# Altium footprint library Main_MCU_2020-08-18_21-02-23.PcbLib: 24 footprints (part 1 of 2)
Each footprint in its own frame and in the unit in brackets; x right, y up, seen from the top. Pads: shape width x height; smd on the part's side, far side on the other; paste and mask are expansions set on the pad; w line width, h text height; cw(c..) or ccw(c..) is an arc to the next point about the centre after c.
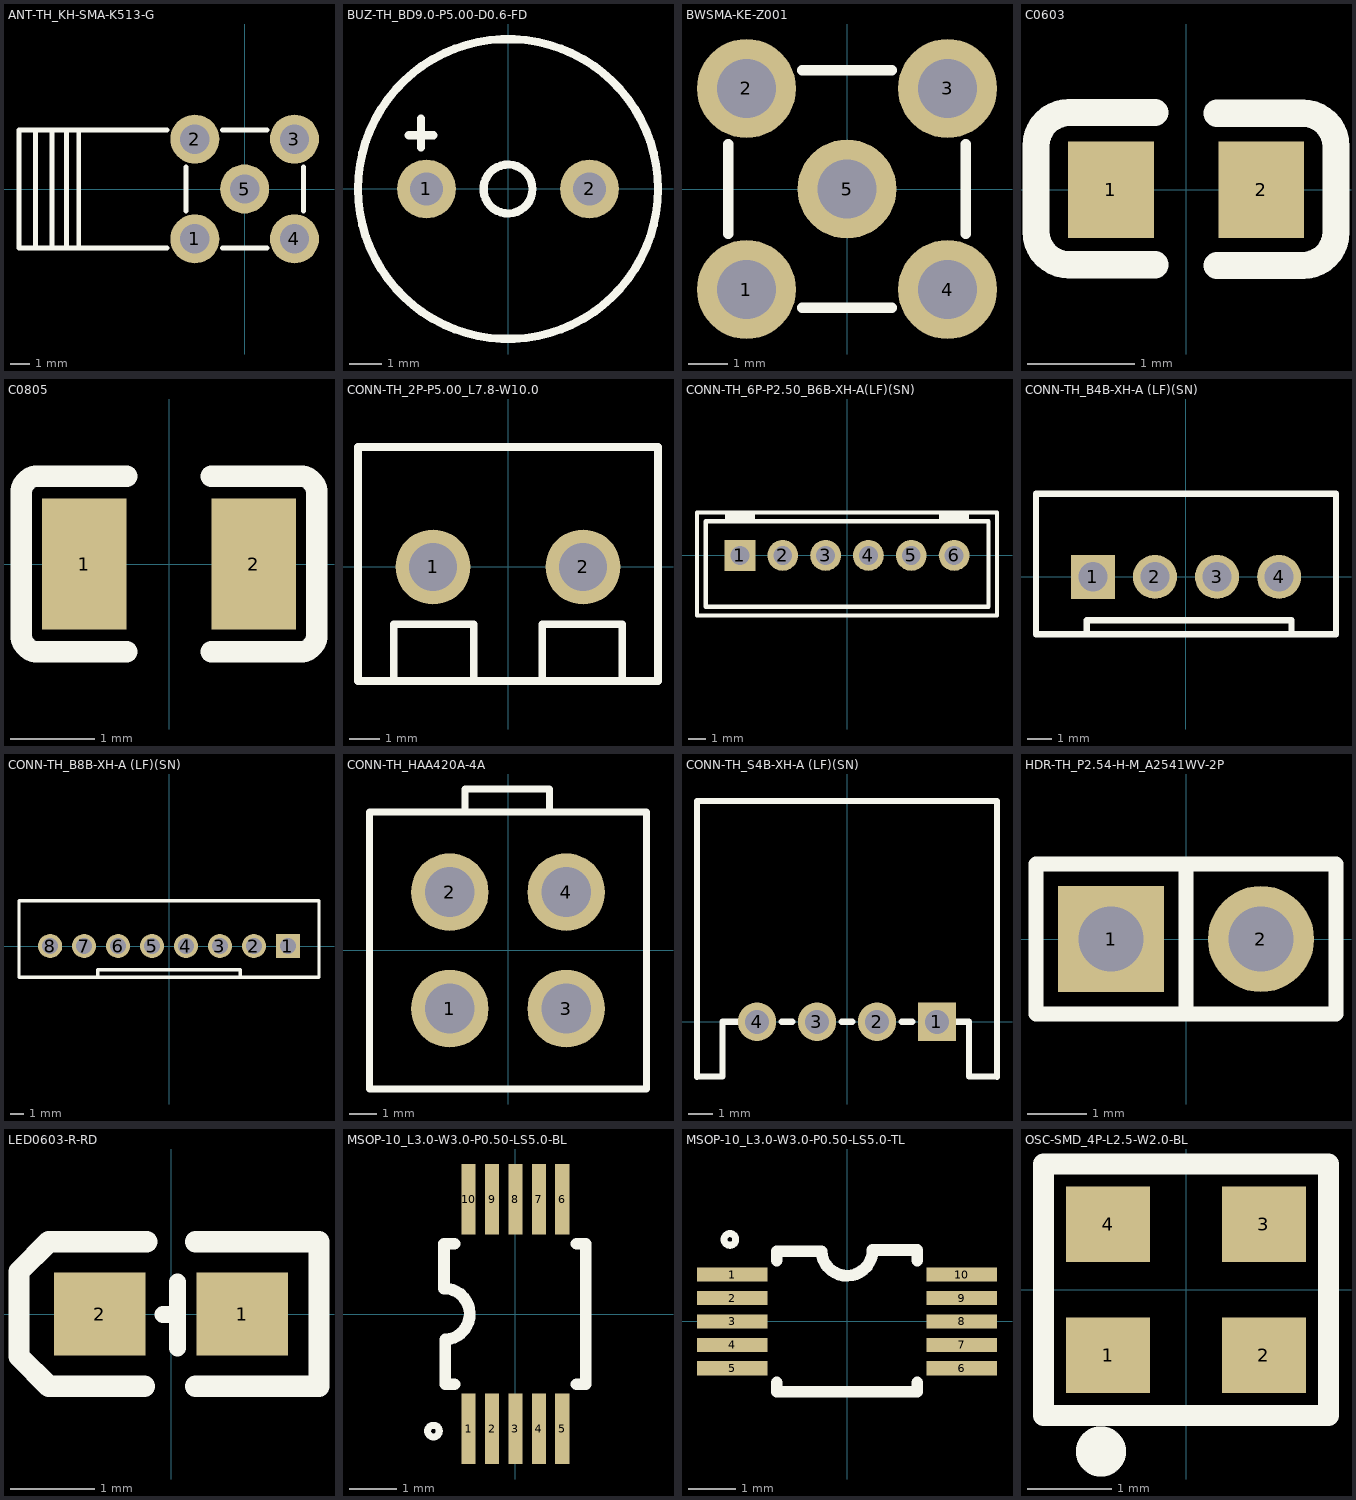
[diagram p0: the footprints below, top view; thin cyan lines are the x and y axes]

## ANT-TH_KH-SMA-K513-G [mm]
pads (5):
  round 2.5 hole 1.5: 1(-2.54,-2.54) 2(-2.54,2.54) 3(2.54,2.54) 4(2.54,-2.54) 5(0,0)
Top Overlay:
  lines w0.254: -10.668,-3 -10.668,3 ; -9.966,3 -9.573,3 ; -9.827,-3 -9.827,3 ; -9.09,-3 -9.09,3 ; -8.595,3 -8.176,3 ; -8.455,-3 -8.455,3 ; -3.948,-3 -11.5,-3 -11.5,3 -3.948,3 ; -3,-1.132 -3,1.132 ; -1.132,-3 1.132,-3 ; -1.132,3 1.132,3 ; 3,-1.132 3,1.132
3D body "SMA-J-P-H-RA-TH1--3DModel-STEP-56544.STEP": height 9.86, standoff -3.94, extent -11.6,-3.5 3.5,3.5

## BUZ-TH_BD9.0-P5.00-D0.6-FD [mm]
pads (2):
  round 1.8 hole 1: 1(-2.5,0) 2(2.5,0)
Top Overlay:
  circle w0.254: c0,0 r4.6
  circle w0.254: c0,0 r0.75
  lines w0.254: -3.048,1.651 -2.286,1.651 ; -2.667,1.27 -2.667,2.159
3D body "CUI_DEVICES_CPE-171.step": height 8, standoff -4, extent -4.483,-4.5 4.517,4.5

## BWSMA-KE-Z001 [mm] "SMA 50Ohm Coaxial Connectors"
pads (5):
  round 2.5 hole 1.5: 1(-2.54,-2.54) 2(-2.54,2.54) 3(2.54,2.54) 4(2.54,-2.54) 5(0,0)
Top Overlay:
  lines w0.254: -3,-1.132 -3,1.132 ; -1.132,-3 1.132,-3 ; -1.132,3 1.132,3 ; 3,-1.132 3,1.132
3D body "733910060.stp": height 9.55, standoff -3.95, extent -3.129,-3.128 3.129,3.128

## C0603 [mm]
pads (2):
  rect 0.8x0.9 smd: 1(-0.7,0) 2(0.7,0)
Top Overlay:
  lines w0.254: -0.289,-0.698 -1.089,-0.698 cw(c-1.089,-0.388) -1.399,-0.388 -1.398,0.412 cw(c-1.089,0.412) -1.089,0.722 -0.289,0.722 ; 0.287,-0.704 1.087,-0.704 ccw(c1.087,-0.394) 1.397,-0.394 1.397,0.406 ccw(c1.087,0.406) 1.087,0.716 0.287,0.716
3D body "C_0603_1608Metric.step": height 0.8, standoff 0, extent -0.8,-0.4 0.8,0.4

## C0805 [mm]
pads (2):
  rect 1x1.55 smd: 1(-1,0) 2(1,0)
Top Overlay:
  lines w0.254: -1.75,0.82 -1.75,0.8 ; -0.5,-1.04 -1.55,-1.04 cw(c-1.55,-0.84) -1.75,-0.84 -1.75,-0.8 -1.75,0.8 ; -0.5,1.04 -1.55,1.04 ccw(c-1.55,0.84) -1.75,0.84 -1.75,0.8 ; 0.5,-1.04 1.55,-1.04 ccw(c1.55,-0.84) 1.75,-0.84 1.75,-0.8 1.75,0.8 1.75,0.84 ccw(c1.55,0.84) 1.55,1.04 0.5,1.04
3D body "C_0805_2012Metric.step": height 1.25, standoff 0, extent -1,-0.615 1,0.635

## CONN-TH_2P-P5.00_L7.8-W10.0 [mm]
pads (2):
  round 2.5 hole 1.6: 1(-2.5,0) 2(2.5,0)
Top Overlay:
  lines w0.254: -3.81,-3.683 -3.81,-1.905 -1.143,-1.905 -1.143,-3.683 ; 1.143,-3.683 1.143,-1.905 3.81,-1.905 3.81,-3.683 ; -5,-3.8 -5,4 5,4 5,-3.8 -5,-3.8
3D body "1729018.stp": height 3.5, standoff -10, extent -4.904,-3.705 5.666,4.445

## CONN-TH_6P-P2.50_B6B-XH-A(LF)(SN) [mm]
pads (6):
  rect 1.8x1.8 hole 1.1: 1(-6.251,0.001)
  round 1.8 hole 1.1: 2(-3.749,-0.001) 3(-1.249,-0.001) 4(1.251,-0.001) 5(3.751,-0.001) 6(6.251,-0.001)
Top Overlay:
  lines w0.254: -7,2 -7,2.5 ; -7,2.25 -5.5,2.25 ; -5.5,2 -5.5,2.5 ; 5.501,2 5.501,2.5 ; 5.501,2.25 7.001,2.25 ; 7.001,2 7.001,2.5 ; -8.75,-3.5 -8.75,2.5 8.75,2.5 8.75,-3.5 -8.75,-3.5 ; -8.25,-3 -8.25,2 8.251,2 8.251,-3 -8.25,-3
3D body "JST_XH_B6B-XH-A_1x06_P2.50mm_Vertical.step": height 7, standoff -3.4, extent -8.701,-3.399 8.699,2.351

## CONN-TH_B4B-XH-A (LF)(SN) [mm]
pads (4):
  rect 1.8x1.8 hole 1.2: 1(-3.81,0)
  round 1.8 hole 1.2: 2(-1.27,0) 3(1.27,0) 4(3.81,0)
Top Overlay:
  lines w0.254: -4.064,-2.286 -4.064,-1.778 4.318,-1.778 4.318,-2.286 ; -6.14,-2.35 -6.14,3.4 6.14,3.4 6.14,-2.35 -6.14,-2.35
3D body "JST_XH_B4B-XH-A_1x04_P2.50mm_Vertical.step": height 7, standoff -3.4, extent -6.2,-2.321 6.2,3.429

## CONN-TH_B8B-XH-A (LF)(SN) [mm]
pads (8):
  rect 1.8x1.8 hole 1.2: 1(8.89,0)
  round 1.8 hole 1.2: 2(6.35,0) 3(3.81,0) 4(1.27,0) 5(-1.27,0) 6(-3.81,0) 7(-6.35,0) 8(-8.89,0)
Top Overlay:
  lines w0.254: -5.334,-2.286 -5.334,-1.778 5.334,-1.778 5.334,-2.286 ; -11.22,-2.35 11.22,-2.35 11.22,3.4 -11.22,3.4 -11.22,-2.35
3D body "JST_XH_B8B-XH-A_1x08_P2.50mm_Vertical.step": height 7, standoff -3.4, extent -11.06,-2.35 11.34,3.4

## CONN-TH_HAA420A-4A [mm]
pads (4):
  round 2.8 hole 1.8: 1(-2.101,-2.101) 2(-2.101,2.101) 3(2.101,-2.101) 4(2.101,2.101)
Top Overlay:
  lines w0.254: -1.559,5.071 -1.559,5.791 ; -1.559,5.821 1.501,5.821 1.501,5.071 ; -5,-5 5,-5 5,5 -5,5 -5,-5
3D body "874270442.stp": height 2.1, standoff -13.5, extent -5.4,-5.35 5.4,6.05

## CONN-TH_S4B-XH-A (LF)(SN) [mm]
pads (4):
  rect 1.6x1.6 hole 1: 1(3.75,0)
  round 1.6 hole 1: 2(1.25,0) 3(-1.25,0) 4(-3.75,0)
Top Overlay:
  lines w0.254: -6.25,-2.3 -6.25,9.2 6.25,9.2 6.25,-2.301 ; -6.25,-2.286 -5.18,-2.286 -5.18,0 ; -4.781,0 -5.18,0 ; -3.783,0 -5.18,0 ; -2.719,0 -2.281,0 ; -0.219,0 0.219,0 ; 2.281,0 2.719,0 ; 3.81,0.127 3.937,0 5.08,0 ; 4.781,0 5.08,0 ; 6.25,-2.286 5.08,-2.286 5.08,0
3D body "JST_XH_S4B-XH-A_1x04_P2.50mm_Horizontal.step": height 6.1, standoff -3.4, extent -6.223,-2.321 6.177,9.179

## HDR-TH_P2.54-H-M_A2541WV-2P [mm]
pads (2):
  rect 1.8x1.8 hole 1.1: 1(-1.27,0)
  round 1.8 hole 1.1: 2(1.27,0)
Top Overlay:
  lines w0.254: -0.001,-1.27 -0.001,1.27 ; -2.54,-1.27 2.54,-1.27 2.54,1.27 -2.54,1.27 -2.54,-1.27

## LED0603-R-RD [mil]
pads (2):
  rect 43x39 smd: 1(33.5,0) 2(-33.5,0)
Top Overlay:
  lines w7.99: -3.9,-0.31 3,-0.31 ; 3,-16 3,15
  lines w10: -12.5,-34 -57.5,-34 -71.5,-20 -71.5,20 -57.5,34 -11.5,34 ; 11.5,-34 69.5,-34 69.5,34 11.5,34
3D body "LED 0603 Lens GREEN.STEP": height 20.87, standoff 7.09, extent -21.65,-15.74 21.66,15.75
3D body "LED 0603 Base GREEN.STEP": height 11.02, standoff 0, extent -31.49,-15.74 31.5,15.75

## MSOP-10_L3.0-W3.0-P0.50-LS5.0-BL [mil]
pads (10):
  rect 12x59.06 smd: 1(-39.37,-96.5) 2(-19.68,-96.5) 3(0,-96.5) 4(19.69,-96.5) 5(39.37,-96.5) 6(39.37,96.5) 7(19.69,96.5) 8(0,96.5) 9(-19.68,96.5) 10(-39.37,96.5)
Top Overlay:
  lines w5.91: -68.95,-93.5 ccw(c-68.9,-98.43) -68.85,-93.5
  lines w10: -51.19,-59.05 -59,-59.05 -59,-21.5 ccw(c-59.92,-0.01) -60,21.5 -60,59.05 -51.19,59.05 ; 51.19,-59.05 59.05,-59.05 59.05,59.05 51.19,59.05
3D body "TSSOP-10_3x3mm_P0.5mm.step": height 39.37, standoff 0, extent -59.06,-96.45 59.05,96.46

## MSOP-10_L3.0-W3.0-P0.50-LS5.0-TL [mil]
pads (10):
  rect 59.06x12 smd: 1(-96.5,39.37) 2(-96.5,19.68) 3(-96.5,0) 4(-96.5,-19.69) 5(-96.5,-39.37) 6(96.5,-39.37) 7(96.5,-19.69) 8(96.5,0) 9(96.5,19.68) 10(96.5,39.37)
Top Overlay:
  lines w5.91: -93.5,68.85 cw(c-98.43,68.9) -93.5,68.95
  lines w10: -59.05,-51.19 -59.05,-59.05 59.05,-59.05 59.05,-51.19 ; -59.05,51.19 -59.05,59 -21.5,59 ccw(c-0.01,59.92) 21.5,60 59.05,60 59.05,51.19
3D body "TSSOP-10_3x3mm_P0.5mm.step": height 39.37, standoff 0, extent -96.45,-59.05 96.46,59.06

## OSC-SMD_4P-L2.5-W2.0-BL [mm]
pads (4):
  rect 1x0.9 smd: 1(-0.93,-0.78) 2(0.93,-0.78) 3(0.93,0.78) 4(-0.93,0.78)
Top Overlay:
  lines w0.254: -1.7,-1.5 -1.7,1.5 1.7,1.5 1.7,-1.5 -1.7,-1.5
  lines w0.3: -1.016,-1.778 ccw(c-1.015,-1.928) -1.013,-1.778
3D body "Crystal_SMD_SeikoEpson_FA238-4Pin_3.2x2.5mm.step": height 0.64, standoff 0, extent -1.599,-1.251 1.601,1.25